# Altium footprint library Molex FFC - FPC Connectors (SMT).PcbLib: 638 footprints (part 40 of 40)
Each footprint in its own frame and in the unit in brackets; x right, y up, seen from the top. Pads: shape width x height; smd on the part's side, far side on the other; paste and mask are expansions set on the pad; w line width, h text height; cw(c..) or ccw(c..) is an arc to the next point about the centre after c.
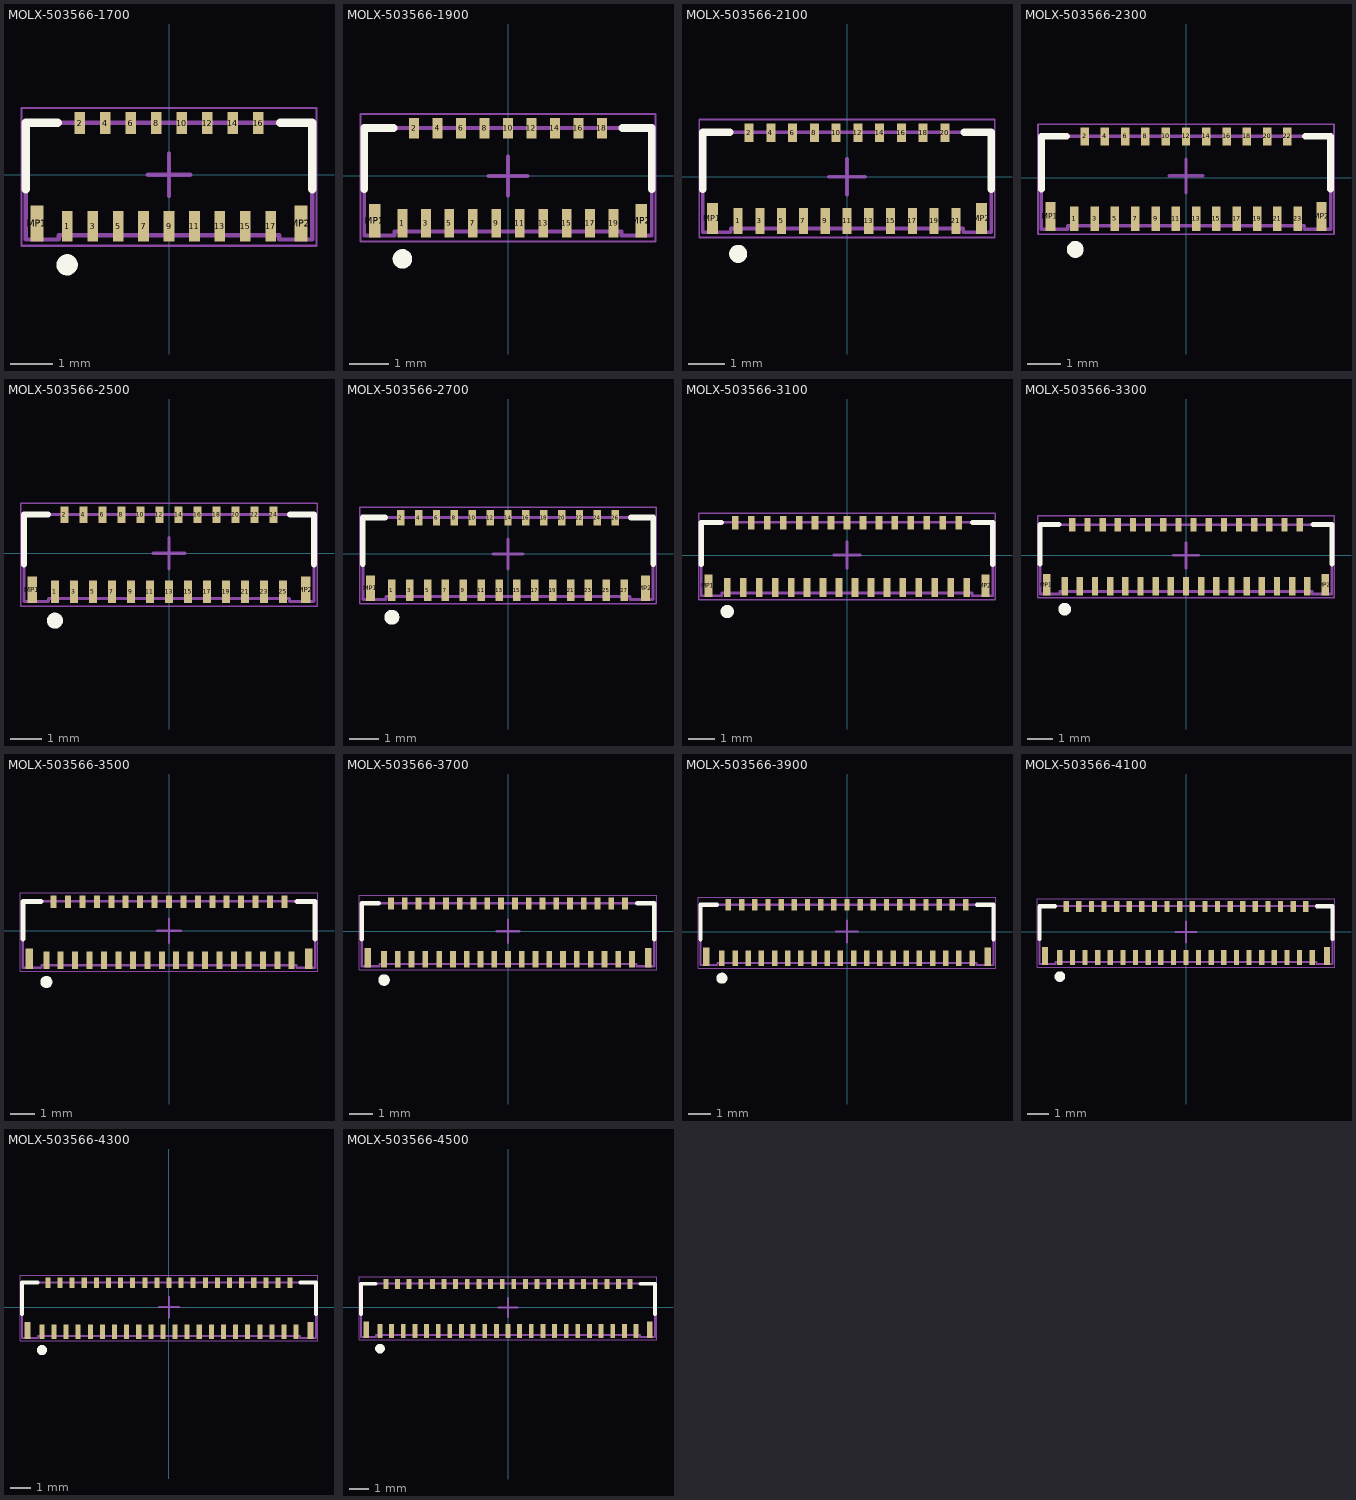
[diagram p39: the footprints below, top view; thin cyan lines are the x and y axes]

## MOLX-503566-1700 [mm] "FPC Connector, 17-Leads, Right Angle, Pitch 0.3 mm, Mated Height 0.95 mm, SMT"
height 0.95
pads (19):
  rect 0.25x0.72 smd: 1(-2.4,-1.215) 3(-1.8,-1.215) 5(-1.2,-1.215) 7(-0.6,-1.215) 9(0,-1.215) 11(0.6,-1.215) 13(1.2,-1.215) 15(1.8,-1.215) 17(2.4,-1.215)
  rect 0.25x0.52 smd: 2(-2.1,1.215) 4(-1.5,1.215) 6(-0.9,1.215) 8(-0.3,1.215) 10(0.3,1.215) 12(0.9,1.215) 14(1.5,1.215) 16(2.1,1.215)
  rect 0.3x0.85 smd: MP1(-3.11,-1.15) MP2(3.11,-1.15)
Top Overlay:
  circle w0.25: c-2.4,-2.125 r0.125
  lines w0.2: -3.375,1.225 -2.625,1.225 ; -3.375,-0.342 -3.375,1.225 ; 2.625,1.225 3.375,1.225 ; 3.375,-0.342 3.375,1.225
Mechanical 13:
  lines w0.1: -3.375,1.225 3.375,1.225 3.375,-1.525 ; -3.375,1.225 -3.375,-1.525 -2.6,-1.525 -2.6,-1.425 2.6,-1.425 2.6,-1.525 3.375,-1.525
Mechanical 15:
  lines w0.05: -3.475,-1.675 -3.475,1.575 3.475,1.575 3.475,-1.675 -3.475,-1.675
  lines w0.1: -0.5,0 0.5,0 ; 0,-0.5 0,0.5
3D body: height 0.25, standoff 0, extent -3.375,-1.525 3.375,1.375

## MOLX-503566-1900 [mm] "FPC Connector, 19-Leads, Right Angle, Pitch 0.3 mm, Mated Height 0.95 mm, SMT"
height 0.95
pads (21):
  rect 0.25x0.72 smd: 1(-2.7,-1.215) 3(-2.1,-1.215) 5(-1.5,-1.215) 7(-0.9,-1.215) 9(-0.3,-1.215) 11(0.3,-1.215) 13(0.9,-1.215) 15(1.5,-1.215) 17(2.1,-1.215) 19(2.7,-1.215)
  rect 0.25x0.52 smd: 2(-2.4,1.215) 4(-1.8,1.215) 6(-1.2,1.215) 8(-0.6,1.215) 10(0,1.215) 12(0.6,1.215) 14(1.2,1.215) 16(1.8,1.215) 18(2.4,1.215)
  rect 0.3x0.85 smd: MP1(-3.41,-1.15) MP2(3.41,-1.15)
Top Overlay:
  circle w0.25: c-2.7,-2.125 r0.125
  lines w0.2: -3.675,-0.342 -3.675,1.225 -2.925,1.225 ; 2.925,1.225 3.675,1.225 3.675,-0.342
Mechanical 13:
  lines w0.1: -2.9,-1.525 -2.9,-1.425 2.9,-1.425 2.9,-1.525 3.675,-1.525 3.675,1.225 -3.675,1.225 -3.675,-1.525 -2.9,-1.525
Mechanical 15:
  lines w0.05: -3.775,-1.675 3.775,-1.675 3.775,1.575 -3.775,1.575 -3.775,-1.675
  lines w0.1: -0.5,0 0.5,0 ; 0,-0.5 0,0.5
3D body: height 0.25, standoff 0, extent -3.675,-1.525 3.675,1.375

## MOLX-503566-2100 [mm] "FPC Connector, 21-Leads, Right Angle, Pitch 0.3 mm, Mated Height 0.95 mm, SMT"
height 0.95
pads (23):
  rect 0.25x0.72 smd: 1(-3,-1.215) 3(-2.4,-1.215) 5(-1.8,-1.215) 7(-1.2,-1.215) 9(-0.6,-1.215) 11(0,-1.215) 13(0.6,-1.215) 15(1.2,-1.215) 17(1.8,-1.215) 19(2.4,-1.215) 21(3,-1.215)
  rect 0.25x0.52 smd: 2(-2.7,1.215) 4(-2.1,1.215) 6(-1.5,1.215) 8(-0.9,1.215) 10(-0.3,1.215) 12(0.3,1.215) 14(0.9,1.215) 16(1.5,1.215) 18(2.1,1.215) 20(2.7,1.215)
  rect 0.3x0.85 smd: MP1(-3.71,-1.15) MP2(3.71,-1.15)
Top Overlay:
  circle w0.25: c-3,-2.125 r0.125
  lines w0.2: -3.975,-0.342 -3.975,1.225 -3.225,1.225 ; 3.225,1.225 3.975,1.225 3.975,-0.342 ; 3.975,1.175 3.975,1.175
Mechanical 13:
  lines w0.1: -3.975,-1.525 -3.2,-1.525 -3.2,-1.425 3.2,-1.425 3.2,-1.525 3.975,-1.525 3.975,1.225 -3.975,1.225 -3.975,-1.525
Mechanical 15:
  lines w0.05: -4.075,-1.675 -4.075,1.575 4.075,1.575 4.075,-1.675 -4.075,-1.675
  lines w0.1: -0.5,0 0.5,0 ; 0,-0.5 0,0.5
3D body: height 0.25, standoff 0, extent -3.975,-1.525 3.975,1.375

## MOLX-503566-2300 [mm] "FPC Connector, 23-Leads, Right Angle, Pitch 0.3 mm, Mated Height 0.95 mm, SMT"
height 0.95
pads (25):
  rect 0.25x0.72 smd: 1(-3.3,-1.215) 3(-2.7,-1.215) 5(-2.1,-1.215) 7(-1.5,-1.215) 9(-0.9,-1.215) 11(-0.3,-1.215) 13(0.3,-1.215) 15(0.9,-1.215) 17(1.5,-1.215) 19(2.1,-1.215) 21(2.7,-1.215) 23(3.3,-1.215)
  rect 0.25x0.52 smd: 2(-3,1.215) 4(-2.4,1.215) 6(-1.8,1.215) 8(-1.2,1.215) 10(-0.6,1.215) 12(0,1.215) 14(0.6,1.215) 16(1.2,1.215) 18(1.8,1.215) 20(2.4,1.215) 22(3,1.215)
  rect 0.3x0.85 smd: MP1(-4.01,-1.15) MP2(4.01,-1.15)
Top Overlay:
  circle w0.25: c-3.275,-2.125 r0.125
  lines w0.2: -4.275,-0.342 -4.275,1.225 -3.525,1.225 ; 3.525,1.225 4.275,1.225 4.275,-0.342
Mechanical 13:
  lines w0.1: -4.275,-1.525 -4.275,1.225 4.275,1.225 4.275,-1.525 3.5,-1.525 3.5,-1.425 -3.5,-1.425 -3.5,-1.525 -4.275,-1.525
Mechanical 15:
  lines w0.05: -4.375,-1.675 4.375,-1.675 4.375,1.575 -4.375,1.575 -4.375,-1.675
  lines w0.1: -0.5,0.05 0.5,0.05 ; 0,-0.45 0,0.55
3D body: height 0.25, standoff 0, extent -4.275,-1.525 4.275,1.375

## MOLX-503566-2500 [mm] "FPC Connector, 25-Leads, Right Angle, Pitch 0.3 mm, Mated Height 0.95 mm, SMT"
height 0.95
pads (27):
  rect 0.25x0.72 smd: 1(-3.6,-1.215) 3(-3,-1.215) 5(-2.4,-1.215) 7(-1.8,-1.215) 9(-1.2,-1.215) 11(-0.6,-1.215) 13(0,-1.215) 15(0.6,-1.215) 17(1.2,-1.215) 19(1.8,-1.215) 21(2.4,-1.215) 23(3,-1.215) 25(3.6,-1.215)
  rect 0.25x0.52 smd: 2(-3.3,1.215) 4(-2.7,1.215) 6(-2.1,1.215) 8(-1.5,1.215) 10(-0.9,1.215) 12(-0.3,1.215) 14(0.3,1.215) 16(0.9,1.215) 18(1.5,1.215) 20(2.1,1.215) 22(2.7,1.215) 24(3.3,1.215)
  rect 0.3x0.85 smd: MP1(-4.31,-1.15) MP2(4.31,-1.15)
Top Overlay:
  circle w0.25: c-3.6,-2.125 r0.125
  lines w0.2: -4.575,-0.342 -4.575,1.225 -3.825,1.225 ; 3.825,1.225 4.575,1.225 ; 4.575,1.175 4.575,1.174 ; 4.575,-0.342 4.575,1.225
Mechanical 13:
  lines w0.1: -4.575,-1.525 -4.575,1.225 4.575,1.225 4.575,-1.525 3.8,-1.525 3.8,-1.425 -3.8,-1.425 -3.8,-1.525 -4.575,-1.525
Mechanical 15:
  lines w0.05: -4.675,-1.675 -4.675,1.575 4.675,1.575 4.675,-1.675 -4.675,-1.675
  lines w0.1: -0.5,0 0.5,0 ; 0,-0.5 0,0.5
3D body: height 0.25, standoff 0, extent -4.575,-1.525 4.575,1.375

## MOLX-503566-2700 [mm] "FPC Connector, 27-Leads, Right Angle, Pitch 0.3 mm, Mated Height 0.95 mm, SMT"
height 0.95
pads (29):
  rect 0.25x0.72 smd: 1(-3.9,-1.215) 3(-3.3,-1.215) 5(-2.7,-1.215) 7(-2.1,-1.215) 9(-1.5,-1.215) 11(-0.9,-1.215) 13(-0.3,-1.215) 15(0.3,-1.215) 17(0.9,-1.215) 19(1.5,-1.215) 21(2.1,-1.215) 23(2.7,-1.215) 25(3.3,-1.215) 27(3.9,-1.215)
  rect 0.25x0.52 smd: 2(-3.6,1.215) 4(-3,1.215) 6(-2.4,1.215) 8(-1.8,1.215) 10(-1.2,1.215) 12(-0.6,1.215) 14(0,1.215) 16(0.6,1.215) 18(1.2,1.215) 20(1.8,1.215) 22(2.4,1.215) 24(3,1.215) 26(3.6,1.215)
  rect 0.3x0.85 smd: MP1(-4.61,-1.15) MP2(4.61,-1.15)
Top Overlay:
  circle w0.25: c-3.9,-2.125 r0.125
  lines w0.2: -4.875,-0.342 -4.875,1.225 -4.125,1.225 ; 4.125,1.225 4.875,1.225 ; 4.875,1.175 4.875,1.174 ; 4.875,-0.342 4.875,1.225
Mechanical 13:
  lines w0.1: -4.875,1.225 4.875,1.225 ; -4.875,-1.525 -4.1,-1.525 -4.1,-1.425 4.1,-1.425 4.1,-1.525 ; -4.875,-1.5 -4.875,1.225 ; 4.1,-1.525 4.875,-1.525 4.875,1.225
Mechanical 15:
  lines w0.05: -4.975,-1.675 -4.975,1.575 4.975,1.575 4.975,-1.675 -4.975,-1.675
  lines w0.1: -0.5,0 0.5,0 ; 0,-0.5 0,0.5
3D body: height 0.25, standoff 0, extent -4.875,-1.525 4.875,1.375

## MOLX-503566-3100 [mm] "FPC Connector, 31-Leads, Right Angle, Pitch 0.3 mm, Mated Height 0.95 mm, SMT"
height 0.95
pads (33):
  rect 0.25x0.72 smd: 1(-4.5,-1.215) 3(-3.9,-1.215) 5(-3.3,-1.215) 7(-2.7,-1.215) 9(-2.1,-1.215) 11(-1.5,-1.215) 13(-0.9,-1.215) 15(-0.3,-1.215) 17(0.3,-1.215) 19(0.9,-1.215) 21(1.5,-1.215) 23(2.1,-1.215) 25(2.7,-1.215) 27(3.3,-1.215) 29(3.9,-1.215) 31(4.5,-1.215)
  rect 0.25x0.52 smd: 2(-4.2,1.215) 4(-3.6,1.215) 6(-3,1.215) 8(-2.4,1.215) 10(-1.8,1.215) 12(-1.2,1.215) 14(-0.6,1.215) 16(0,1.215) 18(0.6,1.215) 20(1.2,1.215) 22(1.8,1.215) 24(2.4,1.215) 26(3,1.215) 28(3.6,1.215) 30(4.2,1.215)
  rect 0.3x0.85 smd: MP1(-5.21,-1.15) MP2(5.21,-1.15)
Top Overlay:
  circle w0.25: c-4.5,-2.125 r0.125
  lines w0.2: -5.475,-0.342 -5.475,1.225 -4.725,1.225 ; 4.725,1.225 5.475,1.225 5.475,-0.342 ; 5.475,1.175 5.475,1.174
Mechanical 13:
  lines w0.1: -5.475,-1.525 -4.7,-1.525 -4.7,-1.425 4.7,-1.425 4.7,-1.525 5.475,-1.525 5.475,1.225 -5.475,1.225 -5.475,-1.525 ; -5.475,-0.375 -5.475,-0.375
Mechanical 15:
  lines w0.05: -5.575,-1.675 5.575,-1.675 5.575,1.575 -5.575,1.575 -5.575,-1.675
  lines w0.1: -0.5,0 0.5,0 ; 0,-0.5 0,0.5
3D body: height 0.25, standoff 0, extent -5.475,-1.525 5.475,1.375

## MOLX-503566-3300 [mm] "FPC Connector, 33-Leads, Right Angle, Pitch 0.3 mm, Mated Height 0.95 mm, SMT"
height 0.95
pads (35):
  rect 0.25x0.72 smd: 1(-4.8,-1.215) 3(-4.2,-1.215) 5(-3.6,-1.215) 7(-3,-1.215) 9(-2.4,-1.215) 11(-1.8,-1.215) 13(-1.2,-1.215) 15(-0.6,-1.215) 17(0,-1.215) 19(0.6,-1.215) 21(1.2,-1.215) 23(1.8,-1.215) 25(2.4,-1.215) 27(3,-1.215) 29(3.6,-1.215) 31(4.2,-1.215) 33(4.8,-1.215)
  rect 0.25x0.52 smd: 2(-4.5,1.215) 4(-3.9,1.215) 6(-3.3,1.215) 8(-2.7,1.215) 10(-2.1,1.215) 12(-1.5,1.215) 14(-0.9,1.215) 16(-0.3,1.215) 18(0.3,1.215) 20(0.9,1.215) 22(1.5,1.215) 24(2.1,1.215) 26(2.7,1.215) 28(3.3,1.215) 30(3.9,1.215) 32(4.5,1.215)
  rect 0.3x0.85 smd: MP1(-5.51,-1.15) MP2(5.51,-1.15)
Top Overlay:
  circle w0.25: c-4.8,-2.125 r0.125
  lines w0.2: -5.775,-0.342 -5.775,1.225 -5.025,1.225 ; 5.025,1.225 5.775,1.225 5.775,-0.342 ; 5.775,1.175 5.775,1.174
Mechanical 13:
  lines w0.1: -5.775,-1.525 -5,-1.525 -5,-1.425 5,-1.425 5,-1.525 5.775,-1.525 5.775,1.225 -5.775,1.225 -5.775,-1.525
Mechanical 15:
  lines w0.05: -5.875,-1.675 5.875,-1.675 5.875,1.575 -5.875,1.575 -5.875,-1.675
  lines w0.1: -0.5,0 0.5,0 ; 0,-0.5 0,0.5
3D body: height 0.25, standoff 0, extent -5.775,-1.525 5.775,1.375

## MOLX-503566-3500 [mm] "FPC Connector, 35-Leads, Right Angle, Pitch 0.3 mm, Mated Height 0.95 mm, SMT"
height 0.95
pads (37):
  rect 0.25x0.72 smd: 1(-5.1,-1.215) 3(-4.5,-1.215) 5(-3.9,-1.215) 7(-3.3,-1.215) 9(-2.7,-1.215) 11(-2.1,-1.215) 13(-1.5,-1.215) 15(-0.9,-1.215) 17(-0.3,-1.215) 19(0.3,-1.215) 21(0.9,-1.215) 23(1.5,-1.215) 25(2.1,-1.215) 27(2.7,-1.215) 29(3.3,-1.215) 31(3.9,-1.215) 33(4.5,-1.215) 35(5.1,-1.215)
  rect 0.25x0.52 smd: 2(-4.8,1.215) 4(-4.2,1.215) 6(-3.6,1.215) 8(-3,1.215) 10(-2.4,1.215) 12(-1.8,1.215) 14(-1.2,1.215) 16(-0.6,1.215) 18(0,1.215) 20(0.6,1.215) 22(1.2,1.215) 24(1.8,1.215) 26(2.4,1.215) 28(3,1.215) 30(3.6,1.215) 32(4.2,1.215) 34(4.8,1.215)
  rect 0.3x0.85 smd: MP1(-5.81,-1.15) MP2(5.81,-1.15)
Top Overlay:
  circle w0.25: c-5.1,-2.125 r0.125
  lines w0.2: -6.075,-0.342 -6.075,1.225 -5.325,1.225 ; 5.325,1.225 6.075,1.225 6.075,-0.342 ; 6.075,1.175 6.075,1.175
Mechanical 13:
  lines w0.1: -5.3,-1.525 -6.075,-1.525 -6.075,1.225 6.075,1.225 6.075,-1.525 ; -5.3,-1.525 -5.3,-1.425 5.3,-1.425 5.3,-1.525 6.075,-1.525
Mechanical 15:
  lines w0.05: -6.175,-1.675 6.175,-1.675 6.175,1.575 -6.175,1.575 -6.175,-1.675
  lines w0.1: -0.5,0 0.5,0 ; 0,-0.5 0,0.5
3D body: height 0.25, standoff 0, extent -6.075,-1.525 6.075,1.375

## MOLX-503566-3700 [mm] "FPC Connector, 37-Leads, Right Angle, Pitch 0.3 mm, Mated Height 0.95 mm, SMT"
height 0.95
pads (39):
  rect 0.25x0.72 smd: 1(-5.4,-1.215) 3(-4.8,-1.215) 5(-4.2,-1.215) 7(-3.6,-1.215) 9(-3,-1.215) 11(-2.4,-1.215) 13(-1.8,-1.215) 15(-1.2,-1.215) 17(-0.6,-1.215) 19(0,-1.215) 21(0.6,-1.215) 23(1.2,-1.215) 25(1.8,-1.215) 27(2.4,-1.215) 29(3,-1.215) 31(3.6,-1.215) 33(4.2,-1.215) 35(4.8,-1.215) 37(5.4,-1.215)
  rect 0.25x0.52 smd: 2(-5.1,1.215) 4(-4.5,1.215) 6(-3.9,1.215) 8(-3.3,1.215) 10(-2.7,1.215) 12(-2.1,1.215) 14(-1.5,1.215) 16(-0.9,1.215) 18(-0.3,1.215) 20(0.3,1.215) 22(0.9,1.215) 24(1.5,1.215) 26(2.1,1.215) 28(2.7,1.215) 30(3.3,1.215) 32(3.9,1.215) 34(4.5,1.215) 36(5.1,1.215)
  rect 0.3x0.85 smd: MP1(-6.11,-1.15) MP2(6.11,-1.15)
Top Overlay:
  circle w0.25: c-5.4,-2.125 r0.125
  lines w0.2: -6.375,-0.342 -6.375,1.225 -5.625,1.225 ; 5.625,1.225 6.375,1.225 ; 6.375,1.175 6.375,1.175 ; 6.375,-0.342 6.375,1.225
Mechanical 13:
  lines w0.1: 5.6,-1.525 5.6,-1.425 -5.6,-1.425 -5.6,-1.525 -6.375,-1.525 -6.375,1.225 6.375,1.225 ; 5.6,-1.525 6.375,-1.525 6.375,1.225
Mechanical 15:
  lines w0.05: -6.475,-1.675 6.475,-1.675 6.475,1.575 -6.475,1.575 -6.475,-1.675
  lines w0.1: -0.5,0 0.5,0 ; 0,-0.5 0,0.5
3D body: height 0.25, standoff 0, extent -6.375,-1.525 6.375,1.375

## MOLX-503566-3900 [mm] "FPC Connector, 39-Leads, Right Angle, Pitch 0.3 mm, Mated Height 0.95 mm, SMT"
height 0.95
pads (41):
  rect 0.25x0.72 smd: 1(-5.7,-1.215) 3(-5.1,-1.215) 5(-4.5,-1.215) 7(-3.9,-1.215) 9(-3.3,-1.215) 11(-2.7,-1.215) 13(-2.1,-1.215) 15(-1.5,-1.215) 17(-0.9,-1.215) 19(-0.3,-1.215) 21(0.3,-1.215) 23(0.9,-1.215) 25(1.5,-1.215) 27(2.1,-1.215) 29(2.7,-1.215) 31(3.3,-1.215) 33(3.9,-1.215) 35(4.5,-1.215) 37(5.1,-1.215) 39(5.7,-1.215)
  rect 0.25x0.52 smd: 2(-5.4,1.215) 4(-4.8,1.215) 6(-4.2,1.215) 8(-3.6,1.215) 10(-3,1.215) 12(-2.4,1.215) 14(-1.8,1.215) 16(-1.2,1.215) 18(-0.6,1.215) 20(0,1.215) 22(0.6,1.215) 24(1.2,1.215) 26(1.8,1.229) 28(2.4,1.229) 30(3,1.229) 32(3.6,1.229) 34(4.2,1.229) 36(4.8,1.229) 38(5.4,1.229)
  rect 0.3x0.85 smd: MP1(-6.41,-1.15) MP2(6.41,-1.15)
Top Overlay:
  circle w0.25: c-5.7,-2.125 r0.125
  lines w0.2: -6.675,-0.342 -6.675,1.225 -5.925,1.225 ; 5.925,1.225 6.675,1.225 6.675,-0.342
Mechanical 13:
  lines w0.1: -6.675,-1.525 -5.9,-1.525 -5.9,-1.425 5.9,-1.425 5.9,-1.525 6.675,-1.525 6.675,1.225 -6.675,1.225 -6.675,-1.525 ; -6.675,1.174 -6.675,1.175
Mechanical 15:
  lines w0.05: -6.775,-1.675 6.775,-1.675 6.775,1.575 -6.775,1.575 -6.775,-1.675
  lines w0.1: -0.5,0 0.5,0 ; 0,-0.5 0,0.5
3D body: height 0.25, standoff 0, extent -6.675,-1.525 6.675,1.375

## MOLX-503566-4100 [mm] "FPC Connector, 41-Leads, Right Angle, Pitch 0.3 mm, Mated Height 0.95 mm, SMT"
height 0.95
pads (43):
  rect 0.25x0.72 smd: 1(-6,-1.215) 3(-5.4,-1.215) 5(-4.8,-1.215) 7(-4.2,-1.215) 9(-3.6,-1.215) 11(-3,-1.215) 13(-2.4,-1.215) 15(-1.8,-1.215) 17(-1.2,-1.215) 19(-0.6,-1.215) 21(0,-1.215) 23(0.6,-1.215) 25(1.2,-1.215) 27(1.8,-1.215) 29(2.4,-1.215) 31(3,-1.215) 33(3.6,-1.215) 35(4.2,-1.215) 37(4.8,-1.215) 39(5.4,-1.215) 41(6,-1.215)
  rect 0.25x0.52 smd: 2(-5.7,1.215) 4(-5.1,1.215) 6(-4.5,1.215) 8(-3.9,1.215) 10(-3.3,1.215) 12(-2.7,1.215) 14(-2.1,1.215) 16(-1.5,1.215) 18(-0.9,1.215) 20(-0.3,1.215) 22(0.3,1.215) 24(0.9,1.215) 26(1.5,1.215) 28(2.1,1.215) 30(2.7,1.215) 32(3.3,1.215) 34(3.9,1.215) 36(4.5,1.215) 38(5.1,1.215) 40(5.7,1.215)
  rect 0.3x0.85 smd: MP1(-6.71,-1.15) MP2(6.71,-1.15)
Top Overlay:
  circle w0.25: c-6,-2.125 r0.125
  lines w0.2: -6.975,-0.342 -6.975,1.225 -6.225,1.225 ; 6.225,1.225 6.975,1.225 6.975,-0.342 ; -6.975,1.175 -6.975,1.175
Mechanical 13:
  lines w0.1: 6.2,-1.525 6.975,-1.525 6.975,1.225 -6.975,1.225 -6.975,-1.525 -6.2,-1.525 -6.2,-1.425 6.2,-1.425 6.2,-1.525 ; -6.975,1.175 -6.975,1.175 ; 6.974,1.175 6.975,1.175
Mechanical 15:
  lines w0.05: -7.075,-1.675 -7.075,1.575 7.075,1.575 7.075,-1.675 -7.075,-1.675
  lines w0.1: -0.5,0 0.5,0 ; 0,-0.5 0,0.5
3D body: height 0.25, standoff 0, extent -6.975,-1.525 6.975,1.375

## MOLX-503566-4300 [mm] "FPC Connector, 43-Leads, Right Angle, Pitch 0.3 mm, Mated Height 0.95 mm, SMT"
height 0.95
pads (45):
  rect 0.25x0.72 smd: 1(-6.3,-1.215) 3(-5.7,-1.215) 5(-5.1,-1.215) 7(-4.5,-1.215) 9(-3.9,-1.215) 11(-3.3,-1.215) 13(-2.7,-1.215) 15(-2.1,-1.215) 17(-1.5,-1.215) 19(-0.9,-1.215) 21(-0.3,-1.215) 23(0.3,-1.215) 25(0.9,-1.215) 27(1.5,-1.215) 29(2.1,-1.215) 31(2.7,-1.215) 33(3.3,-1.215) 35(3.9,-1.215) 37(4.5,-1.215) 39(5.1,-1.215) 41(5.7,-1.215) 43(6.3,-1.215)
  rect 0.25x0.52 smd: 2(-6,1.215) 4(-5.4,1.215) 6(-4.8,1.215) 8(-4.2,1.215) 10(-3.6,1.215) 12(-3,1.215) 14(-2.4,1.215) 16(-1.8,1.215) 18(-1.2,1.215) 20(-0.6,1.215) 22(0,1.215) 24(0.6,1.215) 26(1.2,1.215) 28(1.8,1.215) 30(2.4,1.215) 32(3,1.215) 34(3.6,1.215) 36(4.2,1.215) 38(4.8,1.215) 40(5.4,1.215) 42(6,1.215)
  rect 0.3x0.85 smd: MP1(-7.01,-1.15) MP2(7.01,-1.15)
Top Overlay:
  circle w0.25: c-6.3,-2.125 r0.125
  lines w0.2: -7.275,-0.342 -7.275,1.225 -6.525,1.225 ; 6.525,1.225 7.275,1.225 7.275,-0.342
Mechanical 13:
  lines w0.1: -6.5,-1.525 -6.5,-1.425 6.5,-1.425 6.5,-1.525 7.275,-1.525 ; -6.5,-1.525 -7.275,-1.525 -7.275,1.225 7.275,1.225 ; 7.275,-1.525 7.275,1.225
Mechanical 15:
  lines w0.05: -7.375,-1.675 -7.375,1.575 7.375,1.575 7.375,-1.675 -7.375,-1.675
  lines w0.1: -0.5,0 0.5,0 ; 0,-0.5 0,0.5
3D body: height 0.25, standoff 0, extent -7.275,-1.525 7.275,1.375

## MOLX-503566-4500 [mm] "FPC Connector, 45-Leads, Right Angle, Pitch 0.3 mm, Mated Height 0.95 mm, SMT"
height 0.95
pads (47):
  rect 0.25x0.72 smd: 1(-6.6,-1.215) 3(-6,-1.215) 5(-5.4,-1.215) 7(-4.8,-1.215) 9(-4.2,-1.215) 11(-3.6,-1.215) 13(-3,-1.215) 15(-2.4,-1.215) 17(-1.8,-1.215) 19(-1.2,-1.215) 21(-0.6,-1.215) 23(0,-1.215) 25(0.6,-1.215) 27(1.2,-1.215) 29(1.8,-1.215) 31(2.4,-1.215) 33(3,-1.215) 35(3.6,-1.215) 37(4.2,-1.215) 39(4.8,-1.215) 41(5.4,-1.215) 43(6,-1.215) 45(6.6,-1.215)
  rect 0.25x0.52 smd: 2(-6.3,1.215) 4(-5.7,1.215) 6(-5.1,1.215) 8(-4.5,1.215) 10(-3.9,1.215) 12(-3.3,1.215) 14(-2.7,1.215) 16(-2.1,1.215) 18(-1.5,1.215) 20(-0.9,1.215) 22(-0.3,1.215) 24(0.3,1.215) 26(0.9,1.215) 28(1.5,1.215) 30(2.1,1.215) 32(2.7,1.215) 34(3.3,1.215) 36(3.9,1.215) 38(4.5,1.215) 40(5.1,1.215) 42(5.7,1.215) 44(6.3,1.215)
  rect 0.3x0.85 smd: MP1(-7.31,-1.15) MP2(7.31,-1.15)
Top Overlay:
  circle w0.25: c-6.6,-2.125 r0.125
  lines w0.2: -7.575,-0.342 -7.575,1.225 -6.825,1.225 ; 6.825,1.225 7.575,1.225 7.575,-0.342
Mechanical 13:
  lines w0.1: -7.575,1.225 7.575,1.225 ; -7.575,1.225 -7.575,-1.525 -6.8,-1.525 -6.8,-1.425 6.8,-1.425 6.8,-1.525 7.575,-1.525 7.575,1.225
Mechanical 15:
  lines w0.05: -7.675,-1.675 -7.675,1.575 7.675,1.575 7.675,-1.675 -7.675,-1.675
  lines w0.1: -0.5,0 0.5,0 ; 0,-0.5 0,0.5
3D body: height 0.25, standoff 0, extent -7.575,-1.525 7.575,1.375